# Altium footprint library ALL.PcbLib: 153 footprints (part 6 of 11)
Each footprint in its own frame and in the unit in brackets; x right, y up, seen from the top. Pads: shape width x height; smd on the part's side, far side on the other; paste and mask are expansions set on the pad; w line width, h text height; cw(c..) or ccw(c..) is an arc to the next point about the centre after c.
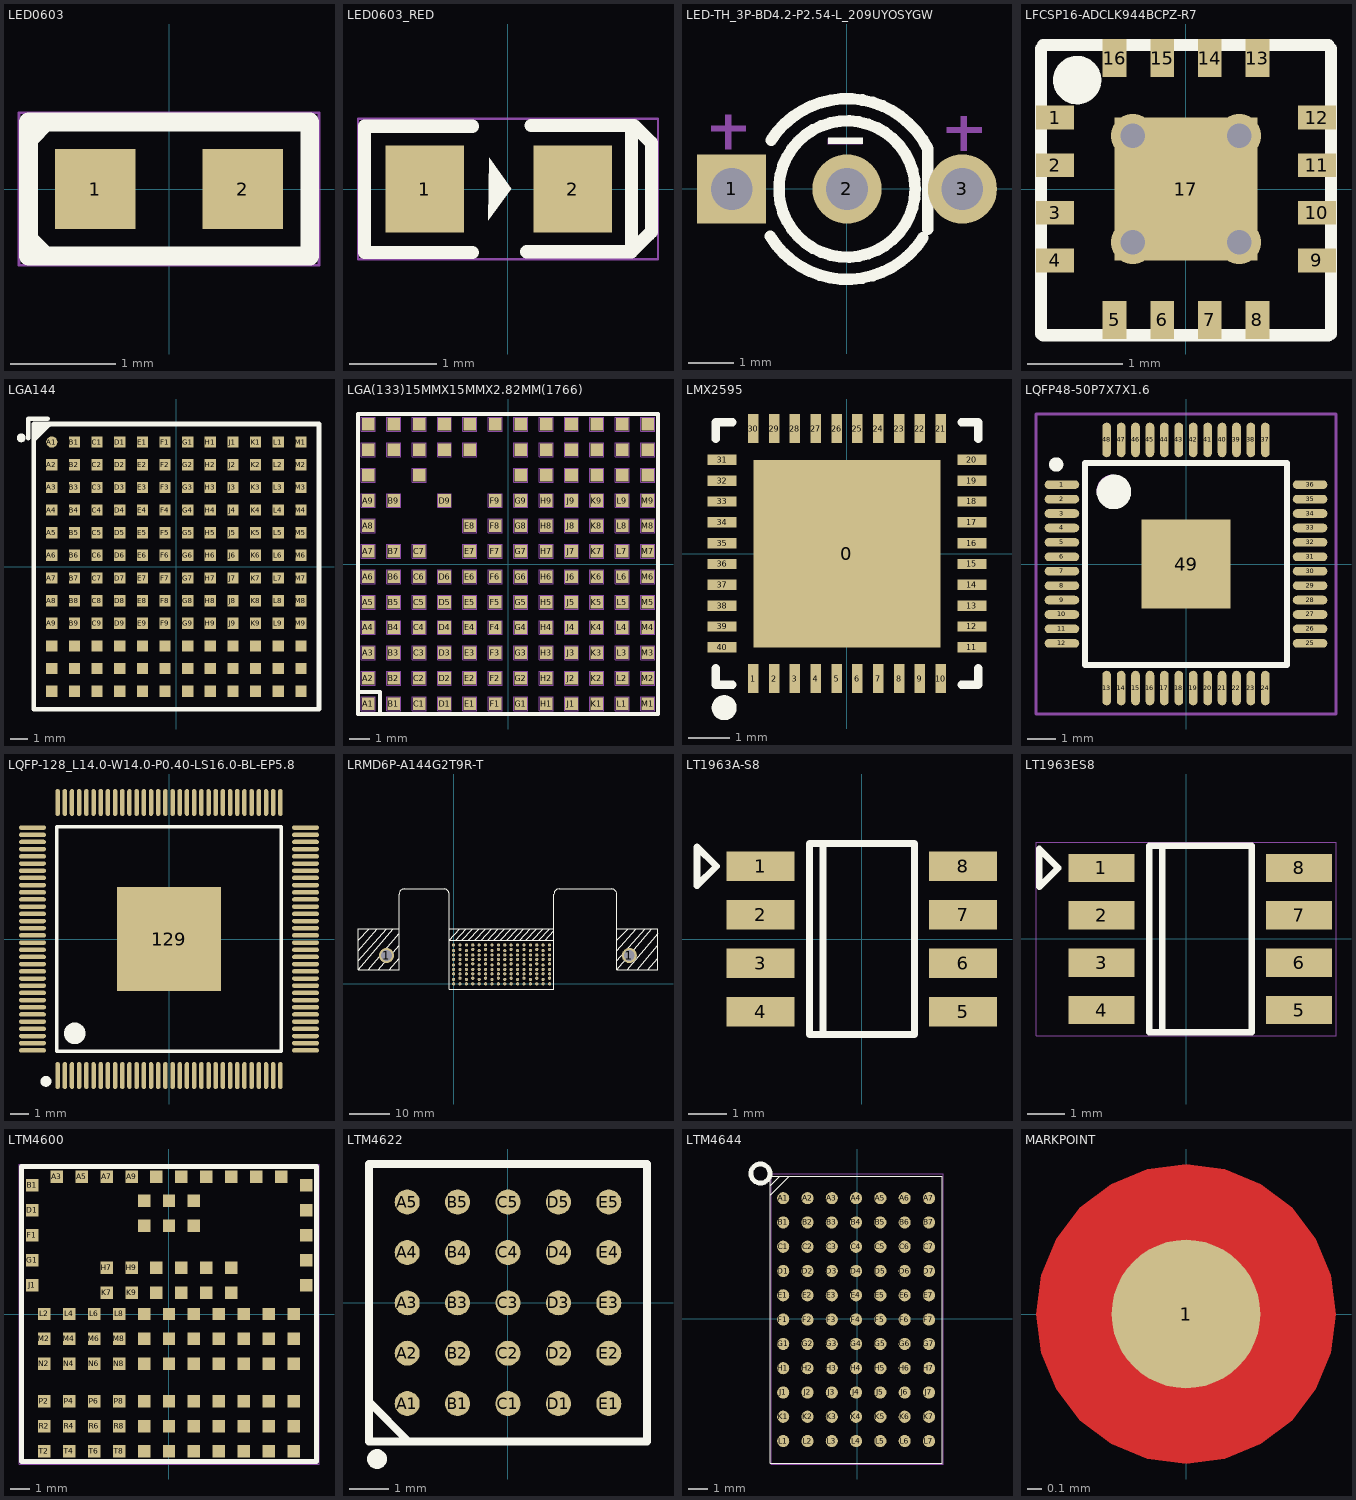
[diagram p5: the footprints below, top view; thin cyan lines are the x and y axes]

## LED0603 [mil] "LED0603"
pads (2):
  rect 30x30 smd: 1(-27.5,0) 2(27.5,0)
Top Overlay:
  lines w7: -52.5,-18.5 -46.49,-24.51 ; -52,18.99 -46,25 ; -52.5,-25 52.5,-25 52.5,25 -52.5,25 -52.5,-25
Mechanical 7:
  lines w1: -56,-28.5 -56,28.5 56,28.5 56,-28.5 -56,-28.5
Mechanical 16:
  text ".Designator" at 0,0 h30

## LED0603_RED [mm] "LED0603_RED"
pads (2):
  rect 0.9x1 smd: 1(-0.955,0) 2(0.745,0)
Top Overlay:
  dashed: -0.215,0.36 -0.225,-0.36 0.035,0
  lines w0.15: -0.405,-0.73 -1.645,-0.73 -1.645,0.72 -0.405,0.72 ; 0.215,-0.72 1.415,-0.72 ; 0.265,0.73 1.415,0.73 ; 1.415,-0.72 1.615,-0.52 1.645,-0.49 1.645,0.53 1.445,0.73 1.415,0.73 ; 1.415,-0.72 1.415,0.73
Mechanical 7:
  lines w0.025: -1.72,-0.805 -1.72,0.805 1.72,0.805 1.72,-0.805 -1.72,-0.805
Mechanical 16:
  text ".Designator" at -0.105,0 h0.76

## LED-TH_3P-BD4.2-P2.54-L_209UYOSYGW [mil]
pads (3):
  rect 60x60 hole 36: 1(-100,0)
  round 60 hole 36: 2(0,0) 3(100,0)
Top Overlay:
  circle w10: c0,0 r59.06
  region: 13.68,44.21 13.68,39.21 -16.32,39.21 -16.32,44.21
  lines w10: -66.65,-41.02 ccw(c0,0) 65.83,-42.32 ; -65.83,42.32 cw(c0,0) 70,35 70,-35
Mechanical 15:
  region: -87.63,55 -87.63,50 -117.63,50 -117.63,55
  region: -100.53,34.37 -105.53,34.37 -105.53,64.37 -100.53,64.37
  region: 103.69,33.05 98.69,33.05 98.69,63.05 103.69,63.05
  region: 116.58,53.68 116.58,48.68 86.58,48.68 86.58,53.68
  region: 13.42,43.68 13.42,38.68 -16.58,38.68 -16.58,43.68

## LFCSP16-ADCLK944BCPZ-R7 [mm]
pads (17):
  rect 0.4x0.25 smd: 1(-1.375,0.75) 2(-1.375,0.25) 3(-1.375,-0.25) 4(-1.375,-0.75) 9(1.375,-0.75) 10(1.375,-0.25) 11(1.375,0.25) 12(1.375,0.75)
  rect 0.25x0.4 smd: 5(-0.75,-1.375) 6(-0.25,-1.375) 7(0.25,-1.375) 8(0.75,-1.375) 13(0.75,1.375) 14(0.25,1.375) 15(-0.25,1.375) 16(-0.75,1.375)
  rect 1.5x1.5 smd: 17(0,0)
via -0.559,-0.559 diameter 0.457 hole 0.254
via 0.559,-0.559 diameter 0.457 hole 0.254
via 0.559,0.559 diameter 0.457 hole 0.254
via -0.559,0.559 diameter 0.457 hole 0.254
Top Overlay:
  circle w0.254: c-1.143,1.143 r0.127
  lines w0.127: -1.524,-1.524 -1.524,1.476 ; -1.502,-1.536 1.498,-1.536 ; -1.502,1.512 1.498,1.512 ; 1.524,-1.524 1.524,1.476

## LGA144 [mm] "LTM4630"
pads (144):
  round 0.63 smd: A1(-6.985,6.985)
  rect 0.63x0.63 smd: A2(-6.985,5.715) A3(-6.985,4.445) A4(-6.985,3.175) A5(-6.985,1.905) A6(-6.985,0.635) A7(-6.985,-0.635) A8(-6.985,-1.905) A9(-6.985,-3.175) A10(-6.985,-4.445) A11(-6.985,-5.715) A12(-6.985,-6.985) B1(-5.715,6.985) B2(-5.715,5.715) B3(-5.715,4.445) B4(-5.715,3.175) B5(-5.715,1.905) B6(-5.715,0.635) B7(-5.715,-0.635) B8(-5.715,-1.905) B9(-5.715,-3.175) B10(-5.715,-4.445) B11(-5.715,-5.715) B12(-5.715,-6.985) C1(-4.445,6.985) C2(-4.445,5.715) C3(-4.445,4.445) C4(-4.445,3.175) C5(-4.445,1.905) C6(-4.445,0.635) C7(-4.445,-0.635) C8(-4.445,-1.905) C9(-4.445,-3.175) C10(-4.445,-4.445) C11(-4.445,-5.715) C12(-4.445,-6.985) D1(-3.175,6.985) D2(-3.175,5.715) D3(-3.175,4.445) D4(-3.175,3.175) D5(-3.175,1.905) D6(-3.175,0.635) D7(-3.175,-0.635) D8(-3.175,-1.905) D9(-3.175,-3.175) D10(-3.175,-4.445) D11(-3.175,-5.715) D12(-3.175,-6.985) E1(-1.905,6.985) E2(-1.905,5.715) E3(-1.905,4.445) E4(-1.905,3.175) E5(-1.905,1.905) E6(-1.905,0.635) E7(-1.905,-0.635) E8(-1.905,-1.905) E9(-1.905,-3.175) E10(-1.905,-4.445) E11(-1.905,-5.715) E12(-1.905,-6.985) F1(-0.635,6.985) F2(-0.635,5.715) F3(-0.635,4.445) F4(-0.635,3.175) F5(-0.635,1.905) F6(-0.635,0.635) F7(-0.635,-0.635) F8(-0.635,-1.905) F9(-0.635,-3.175) F10(-0.635,-4.445) F11(-0.635,-5.715) F12(-0.635,-6.985) G1(0.635,6.985) G2(0.635,5.715) G3(0.635,4.445) G4(0.635,3.175) G5(0.635,1.905) G6(0.635,0.635) G7(0.635,-0.635) G8(0.635,-1.905) G9(0.635,-3.175) G10(0.635,-4.445) G11(0.635,-5.715) G12(0.635,-6.985) H1(1.905,6.985) H2(1.905,5.715) H3(1.905,4.445) H4(1.905,3.175) H5(1.905,1.905) H6(1.905,0.635) H7(1.905,-0.635) H8(1.905,-1.905) H9(1.905,-3.175) H10(1.905,-4.445) H11(1.905,-5.715) H12(1.905,-6.985) J1(3.175,6.985) J2(3.175,5.715) J3(3.175,4.445) J4(3.175,3.175) J5(3.175,1.905) J6(3.175,0.635) J7(3.175,-0.635) J8(3.175,-1.905) J9(3.175,-3.175) J10(3.175,-4.445) J11(3.175,-5.715) J12(3.175,-6.985) K1(4.445,6.985) K2(4.445,5.715) K3(4.445,4.445) K4(4.445,3.175) K5(4.445,1.905) K6(4.445,0.635) K7(4.445,-0.635) K8(4.445,-1.905) K9(4.445,-3.175) K10(4.445,-4.445) K11(4.445,-5.715) K12(4.445,-6.985) L1(5.715,6.985) L2(5.715,5.715) L3(5.715,4.445) L4(5.715,3.175) L5(5.715,1.905) L6(5.715,0.635) L7(5.715,-0.635) L8(5.715,-1.905) L9(5.715,-3.175) L10(5.715,-4.445) L11(5.715,-5.715) L12(5.715,-6.985) M1(6.985,6.985) M2(6.985,5.715) M3(6.985,4.445) M4(6.985,3.175) M5(6.985,1.905) M6(6.985,0.635) M7(6.985,-0.635) M8(6.985,-1.905) M9(6.985,-3.175) M10(6.985,-4.445) M11(6.985,-5.715) M12(6.985,-6.985)
Top Overlay:
  lines w0.249: -8.7,7.1 cw(c-8.699,7.225) -8.697,7.1
  lines w0.254: -8.3,7.2 -8.3,8.3 -7.2,8.3 ; -8,7.1 -7.165,7.935 -7.165,8 ; -8,7.401 -7.401,8 -7.33,8 ; -8,7.6 -7.699,7.901 -7.699,8 ; -8,-8 -8,8 8,8 8,-8 -8,-8

## LGA(133)15MMX15MMX2.82MM(1766) [mm]
pads (133):
  rect 0.63x0.63 smd: A1(-6.985,-6.985) A2(-6.985,-5.715) A3(-6.985,-4.445) A4(-6.985,-3.175) A5(-6.985,-1.905) A6(-6.985,-0.635) A7(-6.985,0.635) A8(-6.985,1.905) A9(-6.985,3.175) A10(-6.985,4.445) A11(-6.985,5.715) A12(-6.985,6.985) B1(-5.715,-6.985) B2(-5.715,-5.715) B3(-5.715,-4.445) B4(-5.715,-3.175) B5(-5.715,-1.905) B6(-5.715,-0.635) B7(-5.715,0.635) B9(-5.715,3.175) B11(-5.715,5.715) B12(-5.715,6.985) C1(-4.445,-6.985) C2(-4.445,-5.715) C3(-4.445,-4.445) C4(-4.445,-3.175) C5(-4.445,-1.905) C6(-4.445,-0.635) C7(-4.445,0.635) C10(-4.445,4.445) C11(-4.445,5.715) C12(-4.445,6.985) D1(-3.175,-6.985) D2(-3.175,-5.715) D3(-3.175,-4.445) D4(-3.175,-3.175) D5(-3.175,-1.905) D6(-3.175,-0.635) D9(-3.175,3.175) D11(-3.175,5.715) D12(-3.175,6.985) E1(-1.905,-6.985) E2(-1.905,-5.715) E3(-1.905,-4.445) E4(-1.905,-3.175) E5(-1.905,-1.905) E6(-1.905,-0.635) E7(-1.905,0.635) E8(-1.905,1.905) E11(-1.905,5.715) E12(-1.905,6.985) F1(-0.635,-6.985) F2(-0.635,-5.715) F3(-0.635,-4.445) F4(-0.635,-3.175) F5(-0.635,-1.905) F6(-0.635,-0.635) F7(-0.635,0.635) F8(-0.635,1.905) F9(-0.635,3.175) F12(-0.635,6.985) G1(0.635,-6.985) G2(0.635,-5.715) G3(0.635,-4.445) G4(0.635,-3.175) G5(0.635,-1.905) G6(0.635,-0.635) G7(0.635,0.635) G8(0.635,1.905) G9(0.635,3.175) G10(0.635,4.445) G11(0.635,5.715) G12(0.635,6.985) H1(1.905,-6.985) H2(1.905,-5.715) H3(1.905,-4.445) H4(1.905,-3.175) H5(1.905,-1.905) H6(1.905,-0.635) H7(1.905,0.635) H8(1.905,1.905) H9(1.905,3.175) H10(1.905,4.445) H11(1.905,5.715) H12(1.905,6.985) J1(3.175,-6.985) J2(3.175,-5.715) J3(3.175,-4.445) J4(3.175,-3.175) J5(3.175,-1.905) J6(3.175,-0.635) J7(3.175,0.635) J8(3.175,1.905) J9(3.175,3.175) J10(3.175,4.445) J11(3.175,5.715) J12(3.175,6.985) K1(4.445,-6.985) K2(4.445,-5.715) K3(4.445,-4.445) K4(4.445,-3.175) K5(4.445,-1.905) K6(4.445,-0.635) K7(4.445,0.635) K8(4.445,1.905) K9(4.445,3.175) K10(4.445,4.445) K11(4.445,5.715) K12(4.445,6.985) L1(5.715,-6.985) L2(5.715,-5.715) L3(5.715,-4.445) L4(5.715,-3.175) L5(5.715,-1.905) L6(5.715,-0.635) L7(5.715,0.635) L8(5.715,1.905) L9(5.715,3.175) L10(5.715,4.445) L11(5.715,5.715) L12(5.715,6.985) M1(6.985,-6.985) M2(6.985,-5.715) M3(6.985,-4.445) M4(6.985,-3.175) M5(6.985,-1.905) M6(6.985,-0.635) M7(6.985,0.635) M8(6.985,1.905) M9(6.985,3.175) M10(6.985,4.445) M11(6.985,5.715) M12(6.985,6.985)
Top Overlay:
  lines w0.2: -7.5,-7.5 -6.4,-7.5 -6.4,-6.4 -7.5,-6.4 -7.5,-7.5 ; -7.5,-7.5 -7.5,7.5 7.5,7.5 7.5,-7.5 -7.5,-7.5
Mechanical 1:
  drawing of 532 lines, arcs and shapes, not listed
Mechanical 16:
  drawing of 532 lines, arcs and shapes, not listed

## LMX2595 [mm]
pads (41):
  rect 4.5x4.5 smd mask+0.05: 0(0,0)
  rect 0.25x0.7 smd mask+0.05: 1(-2.25,-3) 2(-1.75,-3) 3(-1.25,-3) 4(-0.75,-3) 5(-0.25,-3) 6(0.25,-3) 7(0.75,-3) 8(1.25,-3) 9(1.75,-3) 10(2.25,-3) 21(2.25,3) 22(1.75,3) 23(1.25,3) 24(0.75,3) 25(0.25,3) 26(-0.25,3) 27(-0.75,3) 28(-1.25,3) 29(-1.75,3) 30(-2.25,3)
  rect 0.7x0.25 smd mask+0.05: 11(3,-2.25) 12(3,-1.75) 13(3,-1.25) 14(3,-0.75) 15(3,-0.25) 16(3,0.25) 17(3,0.75) 18(3,1.25) 19(3,1.75) 20(3,2.25) 31(-3,2.25) 32(-3,1.75) 33(-3,1.25) 34(-3,0.75) 35(-3,0.25) 36(-3,-0.25) 37(-3,-0.75) 38(-3,-1.25) 39(-3,-1.75) 40(-3,-2.25)
Top Overlay:
  lines w0.2: -3.15,-2.75 -3.15,-3.15 -2.75,-3.15 ; -3.15,2.75 -3.15,3.15 -2.75,3.15 ; 2.75,-3.15 3.15,-3.15 3.15,-2.75 ; 2.75,3.15 3.15,3.15 3.15,2.75
  lines w0.3: -2.949,-3.551 ccw(c-2.948,-3.701) -2.947,-3.551

## LQFP48-50P7X7X1.6 [mm] "LQFP, 48-Leads, Body 9.2x9.2mm (max), Pitch 0.50mm, IPC Medium Density"
height 1.6
pads (49):
  oval 1.2x0.3 smd: 1(-4.3,2.75) 2(-4.3,2.25) 3(-4.3,1.75) 4(-4.3,1.25) 5(-4.3,0.75) 6(-4.3,0.25) 7(-4.3,-0.25) 8(-4.3,-0.75) 9(-4.3,-1.25) 10(-4.3,-1.75) 11(-4.3,-2.25) 12(-4.3,-2.75) 25(4.3,-2.75) 26(4.3,-2.25) 27(4.3,-1.75) 28(4.3,-1.25) 29(4.3,-0.75) 30(4.3,-0.25) 31(4.3,0.25) 32(4.3,0.75) 33(4.3,1.25) 34(4.3,1.75) 35(4.3,2.25) 36(4.3,2.75)
  oval 0.3x1.2 smd: 13(-2.75,-4.3) 14(-2.25,-4.3) 15(-1.75,-4.3) 16(-1.25,-4.3) 17(-0.75,-4.3) 18(-0.25,-4.3) 19(0.25,-4.3) 20(0.75,-4.3) 21(1.25,-4.3) 22(1.75,-4.3) 23(2.25,-4.3) 24(2.75,-4.3) 37(2.75,4.3) 38(2.25,4.3) 39(1.75,4.3) 40(1.25,4.3) 41(0.75,4.3) 42(0.25,4.3) 43(-0.25,4.3) 44(-0.75,4.3) 45(-1.25,4.3) 46(-1.75,4.3) 47(-2.25,4.3) 48(-2.75,4.3)
  rect 3.1x3.1 smd: 49(0,0)
Top Overlay:
  circle w0.25: c-4.5,3.45 r0.125
  circle w0.6: c-2.5,2.5 r0.3
  lines w0.2: -3.5,-3.5 -3.5,3.5 3.5,3.5 3.5,-3.5 -3.5,-3.5
Mechanical 13:
  circle w0.1: c-2.55,2.55 r0.5
  lines w0.1: -3.5,-3.5 -3.5,3.5 3.5,3.5 3.5,-3.5 -3.5,-3.5
Mechanical 15:
  lines w0.1: -0.5,0 0.5,0 ; 0,-0.5 0,0.5 ; -5.2,-5.2 -5.2,5.2 5.2,5.2 5.2,-5.2 -5.2,-5.2
3D body: height 1.6, standoff 0.05, extent -3.5,-3.5 3.5,3.5

## LQFP-128_L14.0-W14.0-P0.40-LS16.0-BL-EP5.8 [mm]
pads (129):
  oval 0.25x1.5 smd: 1(-6.2,-7.6) 2(-5.799,-7.6) 3(-5.4,-7.6) 4(-5.001,-7.6) 5(-4.6,-7.6) 6(-4.201,-7.6) 7(-3.8,-7.6) 8(-3.401,-7.6) 9(-3,-7.6) 10(-2.601,-7.6) 11(-2.2,-7.6) 12(-1.801,-7.6) 13(-1.4,-7.6) 14(-1.001,-7.6) 15(-0.599,-7.6) 16(-0.201,-7.6) 17(0.201,-7.6) 18(0.599,-7.6) 19(1.001,-7.6) 20(1.4,-7.6) 21(1.801,-7.6) 22(2.2,-7.6) 23(2.601,-7.6) 24(3,-7.6) 25(3.401,-7.6) 26(3.8,-7.6) 27(4.201,-7.6) 28(4.6,-7.6) 29(5.001,-7.6) 30(5.4,-7.6) 31(5.799,-7.6) 32(6.2,-7.6) 65(6.2,7.6) 66(5.799,7.6) 67(5.4,7.6) 68(5.001,7.6) 69(4.6,7.6) 70(4.201,7.6) 71(3.8,7.6) 72(3.401,7.6) 73(3,7.6) 74(2.601,7.6) 75(2.2,7.6) 76(1.801,7.6) 77(1.4,7.6) 78(1.001,7.6) 79(0.599,7.6) 80(0.201,7.6) 81(-0.201,7.6) 82(-0.599,7.6) 83(-1.001,7.6) 84(-1.4,7.6) 85(-1.801,7.6) 86(-2.2,7.6) 87(-2.601,7.6) 88(-3,7.6) 89(-3.401,7.6) 90(-3.8,7.6) 91(-4.201,7.6) 92(-4.6,7.6) 93(-5.001,7.6) 94(-5.4,7.6) 95(-5.799,7.6) 96(-6.2,7.6)
  oval 1.5x0.25 smd: 33(7.6,-6.2) 34(7.6,-5.799) 35(7.6,-5.4) 36(7.6,-5.001) 37(7.6,-4.6) 38(7.6,-4.201) 39(7.6,-3.8) 40(7.6,-3.401) 41(7.6,-3) 42(7.6,-2.601) 43(7.6,-2.2) 44(7.6,-1.801) 45(7.6,-1.4) 46(7.6,-1.001) 47(7.6,-0.599) 48(7.6,-0.201) 49(7.6,0.201) 50(7.6,0.599) 51(7.6,1.001) 52(7.6,1.4) 53(7.6,1.801) 54(7.6,2.2) 55(7.6,2.601) 56(7.6,3) 57(7.6,3.401) 58(7.6,3.8) 59(7.6,4.201) 60(7.6,4.6) 61(7.6,5.001) 62(7.6,5.4) 63(7.6,5.799) 64(7.6,6.2) 97(-7.6,6.2) 98(-7.6,5.799) 99(-7.6,5.4) 100(-7.6,5.001) 101(-7.6,4.6) 102(-7.6,4.201) 103(-7.6,3.8) 104(-7.6,3.401) 105(-7.6,3) 106(-7.6,2.601) 107(-7.6,2.2) 108(-7.6,1.801) 109(-7.6,1.4) 110(-7.6,1.001) 111(-7.6,0.599) 112(-7.6,0.201) 113(-7.6,-0.201) 114(-7.6,-0.599) 115(-7.6,-1.001) 116(-7.6,-1.4) 117(-7.6,-1.801) 118(-7.6,-2.2) 119(-7.6,-2.601) 120(-7.6,-3) 121(-7.6,-3.401) 122(-7.6,-3.8) 123(-7.6,-4.201) 124(-7.6,-4.6) 125(-7.6,-5.001) 126(-7.6,-5.4) 127(-7.6,-5.799) 128(-7.6,-6.2)
  rect 5.8x5.8 smd: 129(0,0)
Top Overlay:
  lines w0.2: -6.25,-6.25 6.25,-6.25 6.25,6.25 -6.25,6.25 -6.25,-6.25
  lines w0.3: -6.85,-7.775 ccw(c-6.849,-7.925) -6.848,-7.775
  lines w0.6: -5.25,-4.95 ccw(c-5.248,-5.25) -5.245,-4.95

## LRMD6P-A144G2T9R-T [mm]
pads (146):
  round 3.8 hole 2.7: 1(-16.75,7.08) 1(43.95,7.08)
  round 0.8 hole 0.36: A8(0,0) A9(1.6,0) A10(3.2,0) A11(4.8,0) A12(6.4,0) A13(8,0) A14(9.6,0) A15(11.2,0) A16(12.8,0) A17(14.4,0) A18(16,0) A19(17.6,0) A20(19.2,0) A21(20.8,0) A22(22.4,0) A23(24,0) B8(0,1.1) B9(1.6,1.4) B10(3.2,1.1) B11(4.8,1.4) B12(6.4,1.1) B13(8,1.4) B14(9.6,1.1) B15(11.2,1.4) B16(12.8,1.1) B17(14.4,1.4) B18(16,1.1) B19(17.6,1.4) B20(19.2,1.1) B21(20.8,1.4) B22(22.4,1.1) B23(24,1.4) C8(0,2.5) C9(1.6,2.5) C10(3.2,2.5) C11(4.8,2.5) C12(6.4,2.5) C13(8,2.5) C14(9.6,2.5) C15(11.2,2.5) C16(12.8,2.5) C17(14.4,2.5) C18(16,2.5) C19(17.6,2.5) C20(19.2,2.5) C21(20.8,2.5) C22(22.4,2.5) C23(24,2.5) D8(0,3.6) D9(1.6,3.6) D10(3.2,3.6) D11(4.8,3.6) D12(6.4,3.6) D13(8,3.6) D14(9.6,3.6) D15(11.2,3.6) D16(12.8,3.6) D17(14.4,3.6) D18(16,3.6) D19(17.6,3.6) D20(19.2,3.6) D21(20.8,3.6) D22(22.4,3.6) D23(24,3.6) E8(0,4.7) E9(1.6,5) E10(3.2,4.7) E11(4.8,5) E12(6.4,4.7) E13(8,5) E14(9.6,4.7) E15(11.2,5) E16(12.8,4.7) E17(14.4,5) E18(16,4.7) E19(17.6,5) E20(19.2,4.7) E21(20.8,5) E22(22.4,4.7) E23(24,5) F8(0,6.1) F9(1.6,6.1) F10(3.2,6.1) F11(4.8,6.1) F12(6.4,6.1) F13(8,6.1) F14(9.6,6.1) F15(11.2,6.1) F16(12.8,6.1) F17(14.4,6.1) F18(16,6.1) F19(17.6,6.1) F20(19.2,6.1) F21(20.8,6.1) F22(22.4,6.1) F23(24,6.1) G8(0,7.2) G9(1.6,7.2) G10(3.2,7.2) G11(4.8,7.2) G12(6.4,7.2) G13(8,7.2) G14(9.6,7.2) G15(11.2,7.2) G16(12.8,7.2) G17(14.4,7.2) G18(16,7.2) G19(17.6,7.2) G20(19.2,7.2) G21(20.8,7.2) G22(22.4,7.2) G23(24,7.2) H8(0,8.3) H9(1.6,8.6) H10(3.2,8.3) H11(4.8,8.6) H12(6.4,8.3) H13(8,8.6) H14(9.6,8.3) H15(11.2,8.6) H16(12.8,8.3) H17(14.4,8.6) H18(16,8.3) H19(17.6,8.6) H20(19.2,8.3) H21(20.8,8.6) H22(22.4,8.3) H23(24,8.6) I8(0,9.7) I9(1.6,9.7) I10(3.2,9.7) I11(4.8,9.7) I12(6.4,9.7) I13(8,9.7) I14(9.6,9.7) I15(11.2,9.7) I16(12.8,9.7) I17(14.4,9.7) I18(16,9.7) I19(17.6,9.7) I20(19.2,9.7) I21(20.8,9.7) I22(22.4,9.7) I23(24,9.7)
Top Overlay:
  lines w0.254: -23.9,5.81 -16.75,13.8 ; -23.9,8.3 -19.042,13.811 ; -23.9,10.89 -21.074,13.8 ; -21.328,3.58 -13.581,12.668 ; -18.788,3.58 -13.6,9.7 ; -16.121,3.58 -13.6,6.445 ; -15.105,13.8 -23.9,3.58 ; -13.6,13.8 -23.9,13.8 -23.9,7.08 -23.9,3.58 ; -1.1,13.8 25.1,13.8 ; 0.5,10.89 3.2,13.8 ; 1.6,13.8 -1.1,10.89 25.1,10.89 ; 2.1,10.89 4.8,13.8 ; 3.7,10.89 6.4,13.8 ; 5.3,10.89 8,13.8 ; 6.9,10.89 9.6,13.8 ; 8.5,10.89 11.2,13.8 ; 10.1,10.89 12.8,13.8 ; 11.7,10.89 14.4,13.8 ; 13.3,10.89 16,13.8 ; 14.9,10.89 17.6,13.8 ; 16.5,10.89 19.2,13.8 ; 18.1,10.89 20.8,13.8 ; 19.7,10.89 22.4,13.8 ; 21.3,10.89 24,13.8 ; 22.9,10.89 25.058,13.215 ; 40.8,5.81 47.95,13.8 ; 40.8,8.3 45.658,13.811 ; 40.8,10.89 43.626,13.8 ; 40.8,13.8 51.1,13.8 51.1,7.08 51.1,3.58 43.95,3.58 40.8,3.58 ; 43.372,3.58 51.119,12.668 ; 45.912,3.58 51.1,9.7 ; 48.579,3.58 51.1,6.445 ; 49.595,13.8 40.8,3.58 ; -23.9,3.58 -16.75,3.58 -13.6,3.58 -13.6,7.08 -13.6,21.558 -13.6,22.447 cw(c-12.33,22.447) -12.33,23.717 -2.37,23.717 cw(c-2.37,22.447) -1.1,22.447 -1.1,0 -1.1,-1.3 25.1,-1.3 25.1,0 25.1,21.558 25.1,22.449 cw(c26.37,22.449) 26.37,23.719 39.53,23.719 cw(c39.53,22.449) 40.8,22.449 40.8,21.558 40.8,7.08 40.8,3.58
Drill Guide:
  lines w0.254: -16.75,13.8 -16.75,7.08 ; -13.6,7.08 -16.75,7.08 ; -1.1,0 0,0 0,-1.3 ; 24,-1.3 24,0 25.1,0 ; 40.8,7.08 43.95,7.08 ; 43.95,3.58 43.95,7.08 ; 43.95,13.8 43.95,7.08 ; -23.9,7.08 -16.75,7.08 ; -23.9,7.08 -23.9,13.8 51.1,13.8 51.1,7.08 ; -23.9,7.08 -16.75,7.08 ; 43.95,7.08 51.1,7.08 ; 43.95,7.08 51.1,7.08

## LT1963A-S8 [mil]
pads (8):
  rect 70x30 smd: 1(-104.33,75) 2(-104.33,25) 3(-104.33,-25) 4(-104.33,-75) 5(104.33,-75) 6(104.33,-25) 7(104.33,25) 8(104.33,75)
Top Overlay:
  lines w7: -40,-98.43 -40,98.43 ; -170,55 -170,95 -150,75 -170,55 ; -54.02,-98.43 54.2,-98.43 54.2,98.43 -54.02,98.43 -54.02,-98.43

## LT1963ES8 [mil] "LT1963ES8"
pads (8):
  rect 70x30 smd: 1(-89.25,75) 2(-89.24,25) 3(-89.24,-25) 4(-89.24,-75.01) 5(119.42,-75) 6(119.42,-25) 7(119.42,24.99) 8(119.42,75)
Top Overlay:
  lines w7: -24.91,-98.43 -24.91,98.42 ; -154.91,54.99 -134.91,75 -154.92,94.99 -154.91,54.99 ; -38.93,-98.43 -38.93,98.42 69.29,98.42 69.29,-98.43 -38.93,-98.43
Mechanical 7:
  lines w1: -158.42,-101.93 158.42,-101.93 158.42,101.92 -158.42,101.92 -158.42,-101.93
Mechanical 16:
  text ".Designator" at 15.09,0 h30

## LTM4600 [mm] "LTM4600"
pads (104):
  rect 0.635x0.635 smd: A3(-5.716,6.989) A5(-4.446,6.989) A7(-3.176,6.989) A9(-1.906,6.989) A11(-0.636,6.989) A13(0.634,6.989) A15(1.904,6.989) A17(3.174,6.989) A19(4.444,6.989) A21(5.715,6.989) B1(-6.942,6.548) B23(6.987,6.548) C10(-1.27,5.765) C12(0,5.765) C14(1.27,5.765) D1(-6.942,5.278) D23(6.987,5.278) E10(-1.27,4.495) E12(0,4.495) E14(1.27,4.495) F1(-6.942,4.008) F23(6.987,4.008) G1(-6.942,2.738) G23(6.987,2.738) H7(-3.176,2.36) H9(-1.906,2.36) H11(-0.636,2.36) H13(0.634,2.36) H15(1.904,2.36) H17(3.174,2.36) J1(-6.942,1.468) J23(6.987,1.468) K7(-3.176,1.09) K9(-1.906,1.09) K11(-0.636,1.09) K13(0.634,1.09) K15(1.904,1.09) K17(3.174,1.09) L2(-6.35,0) L4(-5.08,0) L6(-3.81,0) L8(-2.54,0) L10(-1.27,0) L12(0,0) L14(1.27,0) L16(2.54,0) L18(3.81,0) L20(5.08,0) L22(6.35,0) M2(-6.35,-1.27) M4(-5.08,-1.27) M6(-3.81,-1.27) M8(-2.54,-1.27) M10(-1.27,-1.27) M12(0,-1.27) M14(1.27,-1.27) M16(2.54,-1.27) M18(3.81,-1.27) M20(5.08,-1.27) M22(6.35,-1.27) N2(-6.35,-2.54) N4(-5.08,-2.54) N6(-3.81,-2.54) N8(-2.54,-2.54) N10(-1.27,-2.54) N12(0,-2.54) N14(1.27,-2.54) N16(2.54,-2.54) N18(3.81,-2.54) N20(5.08,-2.54) N22(6.35,-2.54) P2(-6.35,-4.445) P4(-5.08,-4.445) P6(-3.81,-4.445) P8(-2.54,-4.445) P10(-1.27,-4.445) P12(0,-4.445) P14(1.27,-4.445) P16(2.54,-4.445) P18(3.81,-4.445) P20(5.08,-4.445) P22(6.35,-4.445) R2(-6.35,-5.715) R4(-5.08,-5.715) R6(-3.81,-5.715) R8(-2.54,-5.715) R10(-1.27,-5.715) R12(0,-5.715) R14(1.27,-5.715) R16(2.54,-5.715) R18(3.81,-5.715) R20(5.08,-5.715) R22(6.35,-5.715) T2(-6.35,-6.985) T4(-5.08,-6.985) T6(-3.81,-6.985) T8(-2.54,-6.985) T10(-1.27,-6.985) T12(0,-6.985) T14(1.27,-6.985) T16(2.54,-6.985) T18(3.81,-6.985) T20(5.08,-6.985) T22(6.35,-6.985)
Top Overlay:
  lines w0.254: -7.5,-7.5 7.5,-7.5 7.5,7.5 -7.5,7.5 -7.5,-7.5
  text ".Designator" at -2.129,-9.211 h0.76
Mechanical 7:
  lines w0.025: -7.627,-7.627 -7.627,7.627 7.627,7.627 7.627,-7.627 -7.627,-7.627

## LTM4622 [mm] "LTM4622"
pads (25):
  round 0.63 smd: A1(-2.54,-2.54) A2(-2.54,-1.27) A3(-2.54,0) A4(-2.54,1.27) A5(-2.54,2.54) B1(-1.27,-2.54) B2(-1.27,-1.27) B3(-1.27,0) B4(-1.27,1.27) B5(-1.27,2.54) C1(0,-2.54) C2(0,-1.27) C3(0,0) C4(0,1.27) C5(0,2.54) D1(1.27,-2.54) D2(1.27,-1.27) D3(1.27,0) D4(1.27,1.27) D5(1.27,2.54) E1(2.54,-2.54) E2(2.54,-1.27) E3(2.54,0) E4(2.54,1.27) E5(2.54,2.54)
Top Overlay:
  circle w0.25: c-3.302,-3.937 r0.125
  lines w0.2: -3.5,-2.5 -2.5,-3.5 ; -3.5,-3.5 3.5,-3.5 3.5,3.5 -3.5,3.5 -3.5,-3.5
Mechanical 7:
  lines w0.025: -3.5,-3.5 3.5,-3.5 3.5,3.5 -3.5,3.5 -3.5,-3.5
Mechanical 16:
  text ".Designator" at 0,0 h0.76

## LTM4644 [mm] "LTM4644"
pads (77):
  round 0.635 smd: A1(-3.862,6.312) A2(-2.592,6.312) A3(-1.322,6.312) A4(-0.052,6.312) A5(1.218,6.312) A6(2.488,6.312) A7(3.758,6.312) B1(-3.862,5.042) B2(-2.592,5.042) B3(-1.322,5.042) B4(-0.052,5.042) B5(1.218,5.042) B6(2.488,5.042) B7(3.758,5.042) C1(-3.862,3.772) C2(-2.592,3.772) C3(-1.322,3.772) C4(-0.052,3.772) C5(1.218,3.772) C6(2.488,3.772) C7(3.758,3.772) D1(-3.862,2.502) D2(-2.592,2.502) D3(-1.322,2.502) D4(-0.052,2.502) D5(1.218,2.502) D6(2.488,2.502) D7(3.758,2.502) E1(-3.862,1.232) E2(-2.592,1.232) E3(-1.322,1.232) E4(-0.052,1.232) E5(1.218,1.232) E6(2.488,1.232) E7(3.758,1.232) F1(-3.862,-0.038) F2(-2.592,-0.038) F3(-1.322,-0.038) F4(-0.052,-0.038) F5(1.218,-0.038) F6(2.488,-0.038) F7(3.758,-0.038) G1(-3.862,-1.308) G2(-2.592,-1.308) G3(-1.322,-1.308) G4(-0.052,-1.308) G5(1.218,-1.308) G6(2.488,-1.308) G7(3.758,-1.308) H1(-3.862,-2.578) H2(-2.592,-2.578) H3(-1.322,-2.578) H4(-0.052,-2.578) H5(1.218,-2.578) H6(2.488,-2.578) H7(3.758,-2.578) J1(-3.862,-3.848) J2(-2.592,-3.848) J3(-1.322,-3.848) J4(-0.052,-3.848) J5(1.218,-3.848) J6(2.488,-3.848) J7(3.758,-3.848) K1(-3.862,-5.118) K2(-2.592,-5.118) K3(-1.322,-5.118) K4(-0.052,-5.118) K5(1.218,-5.118) K6(2.488,-5.118) K7(3.758,-5.118) L1(-3.862,-6.388) L2(-2.592,-6.388) L3(-1.322,-6.388) L4(-0.052,-6.388) L5(1.218,-6.388) L6(2.488,-6.388) L7(3.758,-6.388)
Top Overlay:
  lines w0.05: -4.052,7.463 -4.552,6.962 -4.552,6.463 ; -4.552,6.463 -3.552,7.463 -4.552,6.463 ; -4.552,-7.538 -4.552,7.463 4.448,7.463 4.448,-7.538 -4.552,-7.538
  lines w0.25: -5.552,7.597 ccw(c-5.052,7.598) -5.052,7.098 ccw(c-5.052,7.597) -4.552,7.597 ccw(c-5.052,7.598) -5.052,8.098 ccw(c-5.052,7.597) -5.552,7.597
  text ".Designator" at -2.948,9.894 h0.76
Mechanical 7:
  lines w0.025: -4.497,-7.587 4.498,-7.587 4.498,7.587 -4.497,7.587 -4.497,-7.587

## MARKPOINT [mm]
pads (1):
  round 1 smd mask+0.5: 1(0,0)
Top Layer:
  pour cut-out: 1.009,0 0.974,0.261 0.873,0.504 0.713,0.713 0.504,0.873 0.261,0.974 0,1.009 -0.261,0.974 -0.504,0.873 -0.713,0.713 -0.873,0.504 -0.974,0.261 -1.009,0 -0.974,-0.261 -0.873,-0.504 -0.713,-0.713 -0.504,-0.873 -0.261,-0.974 0,-1.009 0.261,-0.974 0.504,-0.873 0.713,-0.713 0.873,-0.504 0.974,-0.261
Mechanical 8:
  lines w0.1: -0.5,0 0.5,0 ; 0,-0.5 0,0.5